# Altium footprint library Transformers.PcbLib: 81 footprints (part 2 of 6) (continued)
## XFMR_CERN_HCRALWW [mm] "CERN HF Power Transformer RM8" (continued)
Mechanical 14:
  drawing of 158 lines, arcs and shapes, not listed
  text "12" at -12.383,-6.35 h1
  text "11" at -11.43,-2.54 h1
  text "8" at 1.587,10.477 h1
  text "7" at 5.397,10.795 h1
  text "6" at 10.795,5.08 h1
  text "5" at 10.16,1.27 h1
  text "2" at -2.54,-11.43 h1
  text "1" at -5.715,-11.747 h1
3D body "XFMR_CERN_HCRALWW.stp": height 16.5, standoff -3.32, extent -10.555,-10.51 10.464,10.51

## XFMR_CERN_HCRAMPO001 [mm] "CERN HF Current transformer"
height 6.35
pads (2):
  rect 8x6.4 smd paste-4 mask+0.1: 1(-17.5,0) 2(17.5,0)
Keep-Out Layer:
  board cut-out: -5.25,-8.5 -5.25,-2.6 -12,-2.6 -12.098,-2.6 -12.292,-2.562 -12.474,-2.486 -12.637,-2.377 -12.777,-2.237 -12.886,-2.074 -12.962,-1.892 -13,-1.698 -13,-1.6 -13,1.6 -13,1.698 -12.962,1.892 -12.886,2.074 -12.777,2.237 -12.637,2.377 -12.474,2.486 -12.292,2.562 -12.098,2.6 -12,2.6 -5.25,2.6 -5.25,8.5 -5.25,8.598 -5.212,8.792 -5.136,8.974 -5.027,9.137 -4.887,9.277 -4.724,9.386 -4.542,9.462 -4.348,9.5 -4.25,9.5 4.25,9.5 4.348,9.5 4.542,9.462 4.724,9.386 4.887,9.277 5.027,9.137 5.136,8.974 5.212,8.792 5.25,8.598 5.25,8.5 5.25,2.6 12,2.6 12.098,2.6 12.292,2.562 12.474,2.486 12.637,2.377 12.777,2.237 12.886,2.074 12.962,1.892 13,1.698 13,1.6 13,-1.6 13,-1.698 12.962,-1.892 12.886,-2.074 12.777,-2.237 12.637,-2.377 12.474,-2.486 12.292,-2.562 12.098,-2.6 12,-2.6 5.25,-2.6 5.25,-8.5 5.25,-8.598 5.212,-8.792 5.136,-8.974 5.027,-9.137 4.887,-9.277 4.724,-9.386 4.542,-9.462 4.348,-9.5 4.25,-9.5 -4.25,-9.5 -4.348,-9.5 -4.542,-9.462 -4.724,-9.386 -4.887,-9.277 -5.027,-9.137 -5.136,-8.974 -5.212,-8.792 -5.25,-8.598
Mechanical 1:
  lines w1.27: -13,-1.6 ccw(c-12,-1.6) -12,-2.6 -5.25,-2.6 -5.25,-8.5 ccw(c-4.25,-8.5) -4.25,-9.5 4.25,-9.5 ccw(c4.25,-8.5) 5.25,-8.5 5.25,-2.6 12,-2.6 ccw(c12,-1.6) 13,-1.6 13,1.6 ccw(c12,1.6) 12,2.6 5.25,2.6 5.25,8.5 ccw(c4.25,8.5) 4.25,9.5 -4.25,9.5 ccw(c-4.25,8.5) -5.25,8.5 -5.25,2.6 -12,2.6 ccw(c-12,1.6) -13,1.6 -13,-1.6
Mechanical 8:
  lines w0.1: -18,0 -17.5,0 ; -17.5,-0.5 -17.5,0 ; -17.5,0.5 -17.5,0 ; -17,0 -17.5,0 ; -0.5,0 0,0 ; 0,-0.5 0,0 ; 0,0.5 0,0 ; 0.5,0 0,0 ; 17,0 17.5,0 ; 17.5,-0.5 17.5,0 ; 17.5,0.5 17.5,0 ; 18,0 17.5,0 ; -21.5,-3.2 -21.5,3.2 ; -21.5,-3.2 -13.5,-3.2 ; -21.5,-3.2 -21.5,3.2 ; -21.5,-3.2 -13.5,-3.2 ; -21.5,3.2 -13.5,3.2 ; -21.5,3.2 -13.5,3.2 ; -13.5,-3.2 -13.5,3.2 ; 13.5,-3.2 13.5,3.2 ; 13.5,-3.2 21.5,-3.2 ; 13.5,-3.2 21.5,-3.2 ; 13.5,3.2 21.5,3.2 ; 13.5,3.2 21.5,3.2 ; 21.5,-3.2 21.5,3.2 ; 21.5,-3.2 21.5,3.2
Mechanical 14:
  lines w0.1: -12.5,-1.5 -17.55,-1.5 -17.55,1.5 -12.5,1.5 ; -4.7,-2.1 -12.5,-2.1 -12.5,2.1 -4.7,2.1 ; -3.5,-2.3 -2.895,-2.3 ; -3.5,2.3 -2.895,2.3 ; -3.138,-6.666 ccw(c-3.05,-6.818) -3.05,-6.993 3.05,-6.993 ccw(c3.05,-6.818) 3.138,-6.666 ; -2.895,-6.34 -2.895,-6.107 ; -2.895,-5.757 -2.895,-5.266 ; -2.895,-4.916 -2.895,-4.201 ; -2.895,-3.851 -2.895,-2.961 ; -2.895,-2.611 -2.895,-1.599 ; -2.895,-1.249 -2.895,-0.175 ; -2.895,0.175 -2.895,1.249 ; -2.895,1.599 -2.895,2.611 ; -2.895,2.961 -2.895,3.87 ; -2.895,4.22 -2.895,4.916 ; -2.895,5.266 -2.895,5.757 ; -2.895,6.107 -2.895,6.286 ; -2.895,6.636 -2.895,6.637 ; 2.895,-6.34 2.895,-6.107 ; 2.895,-5.757 2.895,-5.266 ; 2.895,-4.916 2.895,-4.201 ; 2.895,-3.851 2.895,-2.961 ; 2.895,-2.611 2.895,-1.599 ; 2.895,-2.3 3.5,-2.3 ; 2.895,-1.249 2.895,-0.175 ; 2.895,0.175 2.895,1.249 ; 2.895,1.599 2.895,2.611 ; 2.895,2.3 3.5,2.3 ; 2.895,2.961 2.895,3.87 ; 2.895,4.22 2.895,4.916 ; 2.895,5.266 2.895,5.757 ; 2.895,6.107 2.895,6.286 ; 2.895,6.636 2.895,6.637 ; 4.7,-2.1 12.5,-2.1 12.5,2.1 4.7,2.1 ; 12.5,-1.5 17.55,-1.5 17.55,1.5 12.5,1.5 ; -4.7,-7 -4.7,7 -3.5,7 -3.5,-7 -4.7,-7 ; -3.05,-6.69 cw(c-3.05,-6.515) -3.05,-6.34 3.05,-6.34 cw(c3.05,-6.515) 3.05,-6.69 -3.05,-6.69 ; -3.05,-6.107 cw(c-3.05,-5.932) -3.05,-5.757 3.05,-5.757 cw(c3.05,-5.932) 3.05,-6.107 -3.05,-6.107 ; -3.05,-5.266 cw(c-3.05,-5.091) -3.05,-4.916 3.05,-4.916 cw(c3.05,-5.091) 3.05,-5.266 -3.05,-5.266 ; -3.05,-4.201 cw(c-3.05,-4.026) -3.05,-3.851 3.05,-3.851 cw(c3.05,-4.026) 3.05,-4.201 -3.05,-4.201 ; -3.05,-2.961 cw(c-3.05,-2.786) -3.05,-2.611 3.05,-2.611 cw(c3.05,-2.786) 3.05,-2.961 -3.05,-2.961 ; -3.05,-1.599 cw(c-3.05,-1.424) -3.05,-1.249 3.05,-1.249 cw(c3.05,-1.424) 3.05,-1.599 -3.05,-1.599 ; -3.05,-0.175 cw(c-3.05,0) -3.05,0.175 3.05,0.175 cw(c3.05,0) 3.05,-0.175 -3.05,-0.175 ; -3.05,1.249 cw(c-3.05,1.424) -3.05,1.599 3.05,1.599 cw(c3.05,1.424) 3.05,1.249 -3.05,1.249 ; -3.05,2.611 cw(c-3.05,2.786) -3.05,2.961 3.05,2.961 cw(c3.05,2.786) 3.05,2.611 -3.05,2.611 ; -3.05,3.87 cw(c-3.05,4.045) -3.05,4.22 3.05,4.22 cw(c3.05,4.045) 3.05,3.87 -3.05,3.87 ; -3.05,4.916 cw(c-3.05,5.091) -3.05,5.266 3.05,5.266 cw(c3.05,5.091) 3.05,4.916 -3.05,4.916 ; -3.05,5.757 cw(c-3.05,5.932) -3.05,6.107 3.05,6.107 cw(c3.05,5.932) 3.05,5.757 -3.05,5.757 ; -3.05,6.286 cw(c-3.05,6.461) -3.05,6.636 3.05,6.636 cw(c3.05,6.461) 3.05,6.286 -3.05,6.286 ; -3.05,6.637 cw(c-3.05,6.812) -3.05,6.987 3.05,6.987 cw(c3.05,6.812) 3.05,6.637 -3.05,6.637 ; 3.5,-7 3.5,7 4.7,7 4.7,-7 3.5,-7
Drill Drawing:
  lines w0.1: -12.06,0.658 -13,1 ; -12.06,1.342 -13,1 ; -4.31,4.658 -5.25,5 ; -4.31,5.342 -5.25,5 ; -2.342,-8.56 -2,-9.5 ; -2.342,8.56 -2,9.5 ; -1.658,-8.56 -2,-9.5 ; -1.658,8.56 -2,9.5 ; 0.998,-7.711 3.548,-7.711 4.999,-9.163 ; 4.093,-8.74 4.999,-9.163 ; 4.31,4.658 5.25,5 ; 4.31,5.342 5.25,5 ; 4.576,-8.256 4.999,-9.163 ; 8.908,-1.66 9.25,-2.6 ; 8.908,1.66 9.25,2.6 ; 9.592,-1.66 9.25,-2.6 ; 9.592,1.66 9.25,2.6 ; 12.06,0.658 13,1 ; 12.06,1.342 13,1 ; -13,1 13,1 ; -5.25,5 5.25,5 ; -2,-9.5 -2,9.5 ; 9.25,-2.6 9.25,2.6 ; -13,-1.6 ccw(c-12,-1.6) -12,-2.6 -5.25,-2.6 -5.25,-8.5 ccw(c-4.25,-8.5) -4.25,-9.5 4.25,-9.5 ccw(c4.25,-8.5) 5.25,-8.5 5.25,-2.6 12,-2.6 ccw(c12,-1.6) 13,-1.6 13,1.6 ccw(c12,1.6) 12,2.6 5.25,2.6 5.25,8.5 ccw(c4.25,8.5) 4.25,9.5 -4.25,9.5 ccw(c-4.25,8.5) -5.25,8.5 -5.25,2.6 -12,2.6 ccw(c-12,1.6) -13,1.6 -13,-1.6
  text "r1" at 1.587,-7.302 h1
  text "19" at -2.222,-2.611 h1
  text "10.5" at 0,5.266 h1
  text "26" at -0.953,1.27 h1
  text "5.2" at 6.35,-0.953 h1
3D body "XFMR_CERN_HCRAMPO001.stp": height 6.52, standoff -7.52, extent -17.55,-7 17.55,7

## XFMR_CLAIRTRONIC_14102 [mm] "CLAIRTRONIC 14102 Encapsulated Transformer 3.5VA - Body 41X35mm"
height 26
pads (6):
  round 1.6 hole 1.1: 1(-12.75,10) 2(-12.75,-10) 3(12.75,10) 4(12.75,5) 5(12.75,-5) 6(12.75,-10)
Top Overlay:
  lines w0.2: -11.25,-10 -10.25,-10 -10.25,-5.25 ccw(c-10.25,-4.5) -10.25,-3.75 ccw(c-10.25,-3) -10.25,-2.25 ccw(c-10.25,-1.5) -10.25,-0.75 ccw(c-10.25,0) -10.25,0.75 ccw(c-10.25,1.5) -10.25,2.25 ccw(c-10.25,3) -10.25,3.75 ccw(c-10.25,4.5) -10.25,5.25 -10.25,10 -11.25,10 ; -0.5,-10 -0.5,10 ; 0.5,-10 0.5,10 ; 11.25,-10 10.25,-10 10.25,-9.75 cw(c10.25,-9) 10.25,-8.25 cw(c10.25,-7.5) 10.25,-6.75 cw(c10.25,-6) 10.25,-5.25 10.25,-5 11.25,-5 ; 11.25,5 10.25,5 10.25,5.25 cw(c10.25,6) 10.25,6.75 cw(c10.25,7.5) 10.25,8.25 cw(c10.25,9) 10.25,9.75 10.25,10 11.25,10 ; -17.5,-20.5 -17.5,20.5 17.5,20.5 17.5,-20.5 -17.5,-20.5
  text "SEC" at 8.85,-9.036 h1.2
  text "SEC" at 8.85,5.964 h1.2
  text "PRIM" at -7.564,-1.746 h1.2
Mechanical 14:
  lines w0.1: -11.25,-10 -10.25,-10 -10.25,-5.25 ccw(c-10.25,-4.5) -10.25,-3.75 ccw(c-10.25,-3) -10.25,-2.25 ccw(c-10.25,-1.5) -10.25,-0.75 ccw(c-10.25,0) -10.25,0.75 ccw(c-10.25,1.5) -10.25,2.25 ccw(c-10.25,3) -10.25,3.75 ccw(c-10.25,4.5) -10.25,5.25 -10.25,10 -11.25,10 ; -0.5,-10 -0.5,10 ; 0.5,-10 0.5,10 ; 11.25,-10 10.25,-10 10.25,-9.75 cw(c10.25,-9) 10.25,-8.25 cw(c10.25,-7.5) 10.25,-6.75 cw(c10.25,-6) 10.25,-5.25 10.25,-5 11.25,-5 ; 11.25,5 10.25,5 10.25,5.25 cw(c10.25,6) 10.25,6.75 cw(c10.25,7.5) 10.25,8.25 cw(c10.25,9) 10.25,9.75 10.25,10 11.25,10 ; -17.5,-20.5 -17.5,20.5 17.5,20.5 17.5,-20.5 -17.5,-20.5
  text "SEC" at 8.85,-9.036 h1.2
  text "SEC" at 8.85,5.964 h1.2
  text "PRIM" at -7.564,-1.746 h1.2
3D body "XFMR_CLAIRTRONIC_14102.stp": height 28, standoff -3.2, extent -17.5,-20.5 17.5,20.5

## XFMR_COILCRAFT_1812WBT2 [mm] "Surface Mount Wideband RF Transformer, Body 4.95 x 3.81mm"
height 3.43
pads (4):
  round 0.5 smd paste-0.26 mask-0.26: 1(-2.07,-0.955) 2(2.07,-0.955) 3(2.07,0.955) 4(-2.07,0.955)
Top Layer:
  region: -2.68,1.68 -1.46,1.68 -1.46,0.74 -1.84,0.23 -2.68,0.23
  region: -2.68,-1.68 -1.46,-1.68 -1.46,-0.74 -1.84,-0.23 -2.68,-0.23
  region: 2.68,-1.68 1.46,-1.68 1.46,-0.74 1.84,-0.23 2.68,-0.23
  region: 2.68,1.68 1.46,1.68 1.46,0.74 1.84,0.23 2.68,0.23
Top Overlay:
  circle w0.25: c-3.25,-0.975 r0.125
  lines w0.2: -2.475,-2.03 2.475,-2.03 ; -2.475,2.03 2.475,2.03
Mechanical 8:
  lines w0.1: -2.57,-0.955 -2.07,-0.955 ; -2.57,0.955 -2.07,0.955 ; -2.07,-1.455 -2.07,-0.955 ; -2.07,-0.455 -2.07,-0.955 ; -2.07,0.455 -2.07,0.955 ; -2.07,1.455 -2.07,0.955 ; -1.57,-0.955 -2.07,-0.955 ; -1.57,0.955 -2.07,0.955 ; -0.5,0 0,0 ; 0,-0.5 0,0 ; 0,0.5 0,0 ; 0.5,0 0,0 ; 1.57,-0.955 2.07,-0.955 ; 1.57,0.955 2.07,0.955 ; 2.07,-1.455 2.07,-0.955 ; 2.07,-0.455 2.07,-0.955 ; 2.07,0.455 2.07,0.955 ; 2.07,1.455 2.07,0.955 ; 2.57,-0.955 2.07,-0.955 ; 2.57,0.955 2.07,0.955 ; -2.68,-1.68 -2.68,-0.23 -1.84,-0.23 -1.46,-0.74 -1.46,-1.68 -2.68,-1.68 ; -2.68,0.23 -2.68,1.68 -1.46,1.68 -1.46,0.74 -1.84,0.23 -2.68,0.23 ; 1.46,-1.68 1.46,-0.74 1.84,-0.23 2.68,-0.23 2.68,-1.68 1.46,-1.68 ; 1.46,0.74 1.46,1.68 2.68,1.68 2.68,0.23 1.84,0.23 1.46,0.74
Mechanical 14:
  circle w0.25: c-3.25,-0.975 r0.125
  circle w0.1: c-1.95,-0.975 r0.3
  lines w0.1: -2.475,-1.53 2.475,-1.53 ; -2.475,1.53 2.475,1.53 ; -1.293,-1.53 -1.293,1.53 ; 1.293,-1.53 1.293,1.53 ; -2.475,-2.03 -2.475,2.03 2.475,2.03 2.475,-2.03 -2.475,-2.03
Mechanical 15:
  lines w0.05: -2.93,-2.28 -2.93,2.28 2.93,2.28 2.93,-2.28 -2.93,-2.28
3D body "XFMR_COILCRAFT_1812WBT2.stp": height 3.44, standoff 0, extent -2.475,-2.03 2.475,2.03

## XFMR_COILCRAFT_GA3459-BL [mm] "Flyback Transformer, Body 26 x 26.75mm"
height 14
pads (12):
  rect 2.75x2 smd: 1(-15.475,10) 2(-15.475,6) 3(-15.475,2) 4(-15.475,-2) 5(-15.475,-6) 6(-15.475,-10) 7(15.475,-10) 8(15.475,-6) 9(15.475,-2) 10(15.475,2) 11(15.475,6) 12(15.475,10)
Top Overlay:
  circle w0.25: c-15.74,12.7 r0.5
  lines w0.2: -13,-3.5 -8.5,-3.5 ; -13,3.5 -8.5,3.5 ; -8.5,-13.375 -8.5,13.375 ; 8.5,-13.375 8.5,13.375 ; 8.5,-3.5 13,-3.5 ; 8.5,3.5 13,3.5 ; -13,-13.375 -13,13.375 13,13.375 13,-13.375 -13,-13.375
Mechanical 8:
  lines w0.1: -15.975,-10 -15.475,-10 ; -15.975,-6 -15.475,-6 ; -15.975,-2 -15.475,-2 ; -15.975,2 -15.475,2 ; -15.975,6 -15.475,6 ; -15.975,10 -15.475,10 ; -15.475,-10.5 -15.475,-10 ; -15.475,-9.5 -15.475,-10 ; -15.475,-6.5 -15.475,-6 ; -15.475,-5.5 -15.475,-6 ; -15.475,-2.5 -15.475,-2 ; -15.475,-1.5 -15.475,-2 ; -15.475,1.5 -15.475,2 ; -15.475,2.5 -15.475,2 ; -15.475,5.5 -15.475,6 ; -15.475,6.5 -15.475,6 ; -15.475,9.5 -15.475,10 ; -15.475,10.5 -15.475,10 ; -14.975,-10 -15.475,-10 ; -14.975,-6 -15.475,-6 ; -14.975,-2 -15.475,-2 ; -14.975,2 -15.475,2 ; -14.975,6 -15.475,6 ; -14.975,10 -15.475,10 ; -0.5,0 0,0 ; 0,-0.5 0,0 ; 0,0.5 0,0 ; 0.5,0 0,0 ; 14.975,-10 15.475,-10 ; 14.975,-6 15.475,-6 ; 14.975,-2 15.475,-2 ; 14.975,2 15.475,2 ; 14.975,6 15.475,6 ; 14.975,10 15.475,10 ; 15.475,-10.5 15.475,-10 ; 15.475,-9.5 15.475,-10 ; 15.475,-6.5 15.475,-6 ; 15.475,-5.5 15.475,-6 ; 15.475,-2.5 15.475,-2 ; 15.475,-1.5 15.475,-2 ; 15.475,1.5 15.475,2 ; 15.475,2.5 15.475,2 ; 15.475,5.5 15.475,6 ; 15.475,6.5 15.475,6 ; 15.475,9.5 15.475,10 ; 15.475,10.5 15.475,10 ; 15.975,-10 15.475,-10 ; 15.975,-6 15.475,-6 ; 15.975,-2 15.475,-2 ; 15.975,2 15.475,2 ; 15.975,6 15.475,6 ; 15.975,10 15.475,10 ; -16.85,-11 -16.85,-9 -14.1,-9 -14.1,-11 -16.85,-11 ; -16.85,-7 -16.85,-5 -14.1,-5 -14.1,-7 -16.85,-7 ; -16.85,-3 -16.85,-1 -14.1,-1 -14.1,-3 -16.85,-3 ; -16.85,1 -16.85,3 -14.1,3 -14.1,1 -16.85,1 ; -16.85,5 -16.85,7 -14.1,7 -14.1,5 -16.85,5 ; -16.85,9 -16.85,11 -14.1,11 -14.1,9 -16.85,9 ; 14.1,-11 14.1,-9 16.85,-9 16.85,-11 14.1,-11 ; 14.1,-7 14.1,-5 16.85,-5 16.85,-7 14.1,-7 ; 14.1,-3 14.1,-1 16.85,-1 16.85,-3 14.1,-3 ; 14.1,1 14.1,3 16.85,3 16.85,1 14.1,1 ; 14.1,5 14.1,7 16.85,7 16.85,5 14.1,5 ; 14.1,9 14.1,11 16.85,11 16.85,9 14.1,9
Mechanical 14:
  circle w0.1: c-10.46,10.16 r1
  lines w0.1: -13,-3.5 -8.5,-3.5 ; -13,3.5 -8.5,3.5 ; -8.5,-13.375 -8.5,13.375 ; 8.5,-13.375 8.5,13.375 ; 8.5,-3.5 13,-3.5 ; 8.5,3.5 13,3.5 ; -13,-13.375 -13,13.375 13,13.375 13,-13.375 -13,-13.375
Mechanical 15:
  lines w0.05: -17.1,-13.625 17.1,-13.625 17.1,13.625 -17.1,13.625 -17.1,-13.625
3D body "XFMR_COILCRAFT_GA3459-BL.stp": height 14, standoff 0, extent -16.325,-13.375 16.325,13.375

## XFMR_COILCRAFT_PWB [mm] "Surface Mount Wideband RF Transformer, Body 6.48mm x 6.48mm"
height 4.65
pads (6):
  rect 1.52x1.27 smd: 1(-2.925,2.54) 2(-2.925,0) 3(-2.925,-2.54) 4(2.925,-2.54) 5(2.925,0) 6(2.925,2.54)
Top Overlay:
  circle w0.25: c-4.4,2.6 r0.125
  lines w0.2: -1.765,-3.485 1.765,-3.485 ; -1.765,3.485 1.765,3.485
Mechanical 8:
  lines w0.1: -3.425,-2.54 -2.925,-2.54 ; -3.425,0 -2.925,0 ; -3.425,2.54 -2.925,2.54 ; -2.925,-3.04 -2.925,-2.54 ; -2.925,-2.04 -2.925,-2.54 ; -2.925,-0.5 -2.925,0 ; -2.925,0.5 -2.925,0 ; -2.925,2.04 -2.925,2.54 ; -2.925,3.04 -2.925,2.54 ; -2.425,-2.54 -2.925,-2.54 ; -2.425,0 -2.925,0 ; -2.425,2.54 -2.925,2.54 ; -0.5,0 0,0 ; 0,-0.5 0,0 ; 0,0.5 0,0 ; 0.5,0 0,0 ; 2.425,-2.54 2.925,-2.54 ; 2.425,0 2.925,0 ; 2.425,2.54 2.925,2.54 ; 2.925,-3.04 2.925,-2.54 ; 2.925,-2.04 2.925,-2.54 ; 2.925,-0.5 2.925,0 ; 2.925,0.5 2.925,0 ; 2.925,2.04 2.925,2.54 ; 2.925,3.04 2.925,2.54 ; 3.425,-2.54 2.925,-2.54 ; 3.425,0 2.925,0 ; 3.425,2.54 2.925,2.54 ; -3.685,-3.175 -3.685,-1.905 -2.165,-1.905 -2.165,-3.175 -3.685,-3.175 ; -3.685,-0.635 -3.685,0.635 -2.165,0.635 -2.165,-0.635 -3.685,-0.635 ; -3.685,1.905 -3.685,3.175 -2.165,3.175 -2.165,1.905 -3.685,1.905 ; 2.165,-3.175 2.165,-1.905 3.685,-1.905 3.685,-3.175 2.165,-3.175 ; 2.165,-0.635 2.165,0.635 3.685,0.635 3.685,-0.635 2.165,-0.635 ; 2.165,1.905 2.165,3.175 3.685,3.175 3.685,1.905 2.165,1.905
Mechanical 14:
  lines w0.1: -3.34,-2.79 -3.6,-2.79 -3.6,-2.29 -3.34,-2.29 ; -3.34,-0.25 -3.6,-0.25 -3.6,0.25 -3.34,0.25 ; -3.34,2.29 -3.6,2.29 -3.6,2.79 -3.34,2.79 ; -3.34,2.635 -2.7,2.635 -2.7,3.079 -3.34,3.079 ; 3.34,-2.79 3.6,-2.79 3.6,-2.29 3.34,-2.29 ; 3.34,-0.25 3.6,-0.25 3.6,0.25 3.34,0.25 ; 3.34,2.29 3.6,2.29 3.6,2.79 3.34,2.79 ; -3.34,-3.485 -3.34,3.485 3.34,3.485 3.34,-3.485 -3.34,-3.485
Mechanical 15:
  lines w0.05: -3.935,-3.735 3.935,-3.735 3.935,3.735 -3.935,3.735 -3.935,-3.735
3D body "XFMR_COILCRAFT_PWB.stp": height 4.65, standoff 0, extent -3.6,-3.485 3.6,3.485

## XFMR_COILCRAFT_Q4470 [mm] "Miniature Surface Mount Transformer, Body 6.6mm x 8.89mm"
height 5.46
pads (6):
  rect 1.27x1.27 smd: 1(-4.13,2.54) 2(-4.13,0) 3(-4.13,-2.54) 4(4.13,-2.54) 5(4.13,0) 6(4.13,2.54)
Top Overlay:
  circle w0.25: c-4.125,3.8 r0.125
  lines w0.2: -3.145,-3.525 -3.145,3.525 3.145,3.525 3.145,-3.525 -3.145,-3.525
Mechanical 8:
  lines w0.1: -4.63,-2.54 -4.13,-2.54 ; -4.63,0 -4.13,0 ; -4.63,2.54 -4.13,2.54 ; -4.13,-3.04 -4.13,-2.54 ; -4.13,-2.04 -4.13,-2.54 ; -4.13,-0.5 -4.13,0 ; -4.13,0.5 -4.13,0 ; -4.13,2.04 -4.13,2.54 ; -4.13,3.04 -4.13,2.54 ; -3.63,-2.54 -4.13,-2.54 ; -3.63,0 -4.13,0 ; -3.63,2.54 -4.13,2.54 ; -1,0 0,0 ; 0,-1 0,0 ; 0,1 0,0 ; 1,0 0,0 ; 3.63,-2.54 4.13,-2.54 ; 3.63,0 4.13,0 ; 3.63,2.54 4.13,2.54 ; 4.13,-3.04 4.13,-2.54 ; 4.13,-2.04 4.13,-2.54 ; 4.13,-0.5 4.13,0 ; 4.13,0.5 4.13,0 ; 4.13,2.04 4.13,2.54 ; 4.13,3.04 4.13,2.54 ; 4.63,-2.54 4.13,-2.54 ; 4.63,0 4.13,0 ; 4.63,2.54 4.13,2.54 ; -4.765,-3.175 -4.765,-1.905 -3.495,-1.905 -3.495,-3.175 -4.765,-3.175 ; -4.765,-0.635 -4.765,0.635 -3.495,0.635 -3.495,-0.635 -4.765,-0.635 ; -4.765,1.905 -4.765,3.175 -3.495,3.175 -3.495,1.905 -4.765,1.905 ; 3.495,-3.175 3.495,-1.905 4.765,-1.905 4.765,-3.175 3.495,-3.175 ; 3.495,-0.635 3.495,0.635 4.765,0.635 4.765,-0.635 3.495,-0.635 ; 3.495,1.905 3.495,3.175 4.765,3.175 4.765,1.905 3.495,1.905
Mechanical 14:
  circle w0.1: c-2.457,2.75 r0.4
  lines w0.1: -3.3,-2.84 -4.445,-2.84 -4.445,-2.24 -3.3,-2.24 ; -3.3,-0.3 -4.445,-0.3 -4.445,0.3 -3.3,0.3 ; -3.3,2.24 -4.445,2.24 -4.445,2.84 -3.3,2.84 ; 3.3,-2.84 4.445,-2.84 4.445,-2.24 3.3,-2.24 ; 3.3,-0.3 4.445,-0.3 4.445,0.3 3.3,0.3 ; 3.3,2.24 4.445,2.24 4.445,2.84 3.3,2.84 ; -3.3,-3.495 -3.3,3.495 3.3,3.495 3.3,-3.495 -3.3,-3.495
Mechanical 15:
  lines w0.05: -5.015,-3.745 5.015,-3.745 5.015,3.745 -5.015,3.745 -5.015,-3.745
3D body "XFMR_COILCRAFT_Q4470.stp": height 5.46, standoff 0, extent -4.445,-3.495 4.445,3.495

## XFMR_COILCRAFT_TTWB [mm] "Surface Mount Wideband RF Transformer, Body 6.48mm x 6.1mm"
height 4.82
pads (6):
  rect 1.14x1.27 smd: 1(-2.73,2.54) 2(-2.73,0) 3(-2.73,-2.54) 4(2.73,-2.54) 5(2.73,0) 6(2.73,2.54)
Top Overlay:
  circle w0.2: c0.076,2.158 r0.25
  circle w0.2: c-0.75,2.158 r0.25
  circle w0.2: c0.95,2.158 r0.25
  circle w0.25: c-3.8,2.6 r0.125
  lines w0.2: -3.302,-1.605 -3.302,-0.935 ; -3.302,0.935 -3.302,1.605 ; -1.86,-3.112 1.86,-3.112 ; -1.86,3.112 1.86,3.112 ; 3.302,-1.605 3.302,-0.935 ; 3.302,0.935 3.302,1.605
Mechanical 8:
  lines w0.1: -3.23,-2.54 -2.73,-2.54 ; -3.23,0 -2.73,0 ; -3.23,2.54 -2.73,2.54 ; -2.73,-3.04 -2.73,-2.54 ; -2.73,-2.04 -2.73,-2.54 ; -2.73,-0.5 -2.73,0 ; -2.73,0.5 -2.73,0 ; -2.73,2.04 -2.73,2.54 ; -2.73,3.04 -2.73,2.54 ; -2.23,-2.54 -2.73,-2.54 ; -2.23,0 -2.73,0 ; -2.23,2.54 -2.73,2.54 ; -0.5,0 0,0 ; 0,-0.5 0,0 ; 0,0.5 0,0 ; 0.5,0 0,0 ; 2.23,-2.54 2.73,-2.54 ; 2.23,0 2.73,0 ; 2.23,2.54 2.73,2.54 ; 2.73,-3.04 2.73,-2.54 ; 2.73,-2.04 2.73,-2.54 ; 2.73,-0.5 2.73,0 ; 2.73,0.5 2.73,0 ; 2.73,2.04 2.73,2.54 ; 2.73,3.04 2.73,2.54 ; 3.23,-2.54 2.73,-2.54 ; 3.23,0 2.73,0 ; 3.23,2.54 2.73,2.54 ; -3.3,-3.175 -2.16,-3.175 -2.16,-1.905 -3.3,-1.905 -3.3,-3.175 ; -3.3,-0.635 -2.16,-0.635 -2.16,0.635 -3.3,0.635 -3.3,-0.635 ; -3.3,1.905 -2.16,1.905 -2.16,3.175 -3.3,3.175 -3.3,1.905 ; 2.16,-3.175 3.3,-3.175 3.3,-1.905 2.16,-1.905 2.16,-3.175 ; 2.16,-0.635 3.3,-0.635 3.3,0.635 2.16,0.635 2.16,-0.635 ; 2.16,1.905 3.3,1.905 3.3,3.175 2.16,3.175 2.16,1.905
Mechanical 14:
  circle w0.1: c2.223,2.158 r0.25
  circle w0.1: c-2.109,2.158 r0.25
  circle w0.1: c0.076,2.158 r0.25
  lines w0.1: -3.302,-3.112 -3.302,3.112 3.302,3.112 3.302,-3.112 -3.302,-3.112
Mechanical 15:
  lines w0.05: -3.552,-3.362 -3.552,3.362 3.552,3.362 3.552,-3.362 -3.552,-3.362
3D body "XFMR_COILCRAFT_TTWB.stp": height 4.7, standoff 0, extent -3.302,-3.111 3.302,3.112

## XFMR_COILCRAFT_WBC [mm] "Surface Mount Mini Wideband Transformer, Body 4.19mm x 4.45mm"
height 3.05
pads (6):
  rect 1.14x0.76 smd: 1(-1.525,-1.52) 2(-1.525,0) 3(-1.525,1.52) 4(1.525,1.52) 5(1.525,0) 6(1.525,-1.52)
Top Overlay:
  circle w0.25: c-2.7,-1.6 r0.125
  lines w0.1: -0.655,-2.1 0.655,-2.1 ; -0.655,-1.9 0.655,-1.9 ; -0.655,1.9 0.655,1.9 ; -0.655,2.1 0.655,2.1
Mechanical 8:
  lines w0.1: -2.025,-1.52 -1.525,-1.52 ; -2.025,0 -1.525,0 ; -2.025,1.52 -1.525,1.52 ; -1.525,-2.02 -1.525,-1.52 ; -1.525,-1.02 -1.525,-1.52 ; -1.525,-0.5 -1.525,0 ; -1.525,0.5 -1.525,0 ; -1.525,1.02 -1.525,1.52 ; -1.525,2.02 -1.525,1.52 ; -1.025,-1.52 -1.525,-1.52 ; -1.025,0 -1.525,0 ; -1.025,1.52 -1.525,1.52 ; -0.5,0 0,0 ; 0,-0.5 0,0 ; 0,0.5 0,0 ; 0.5,0 0,0 ; 1.025,-1.52 1.525,-1.52 ; 1.025,0 1.525,0 ; 1.025,1.52 1.525,1.52 ; 1.525,-2.02 1.525,-1.52 ; 1.525,-1.02 1.525,-1.52 ; 1.525,-0.5 1.525,0 ; 1.525,0.5 1.525,0 ; 1.525,1.02 1.525,1.52 ; 1.525,2.02 1.525,1.52 ; 2.025,-1.52 1.525,-1.52 ; 2.025,0 1.525,0 ; 2.025,1.52 1.525,1.52 ; -2.095,-1.9 -0.955,-1.9 -0.955,-1.14 -2.095,-1.14 -2.095,-1.9 ; -2.095,-0.38 -0.955,-0.38 -0.955,0.38 -2.095,0.38 -2.095,-0.38 ; -2.095,1.14 -0.955,1.14 -0.955,1.9 -2.095,1.9 -2.095,1.14 ; 0.955,-1.9 2.095,-1.9 2.095,-1.14 0.955,-1.14 0.955,-1.9 ; 0.955,-0.38 2.095,-0.38 2.095,0.38 0.955,0.38 0.955,-0.38 ; 0.955,1.14 2.095,1.14 2.095,1.9 0.955,1.9 0.955,1.14
Mechanical 14:
  circle w0.1: c-0.525,-1.52 r0.25
  lines w0.1: -1.325,-0.508 cw(c-0.935,0.01) -1.325,0.528 ; 1.325,-0.508 ccw(c0.935,0.01) 1.325,0.528 ; -2.225,-2.1 2.225,-2.1 2.225,2.1 -2.225,2.1 -2.225,-2.1 ; -1.325,-1.9 1.325,-1.9 1.325,1.9 -1.325,1.9 -1.325,-1.9
Mechanical 15:
  lines w0.1: -2.475,-2.35 2.475,-2.35 2.475,2.35 -2.475,2.35 -2.475,-2.35
3D body "XFMR_COILCRAFT_WBC.stp": height 3.01, standoff 0, extent -2.225,-2.1 2.225,2.1

## XFMR_COMATEC_12052912 [mm] "230VAC to 9.5VAC 2VA, Custom Transformer, Body 28mm x 33mm"
height 27
pads (4):
  round 2.3 hole 1.6: 1(-10,10) 2(-10,-10) 3(10,5) 4(10,-5)
Top Overlay:
  lines w0.2: -10.25,-11.53 -10.25,-12.25 10.25,-12.25 10.25,-6.53 ; -10.25,-8.47 -10.25,8.47 ; -10.25,11.53 -10.25,12.25 10.25,12.25 10.25,6.53 ; 10.25,-3.47 10.25,3.47 ; -14,-16.5 -14,16.5 14,16.5 14,-16.5 -14,-16.5
  text "S1" at 12.825,-0.85 h1.2
  text "P1" at -11.5,-0.875 h1.2
Mechanical 8:
  lines w0.1: -10.5,-10 -10,-10 ; -10.5,10 -10,10 ; -10,-10.5 -10,-10 ; -10,-9.5 -10,-10 ; -10,9.5 -10,10 ; -10,10.5 -10,10 ; -9.5,-10 -10,-10 ; -9.5,10 -10,10 ; -0.5,0 0,0 ; 0,-0.5 0,0 ; 0,0.5 0,0 ; 0.5,0 0,0 ; 9.5,-5 10,-5 ; 9.5,5 10,5 ; 10,-5.5 10,-5 ; 10,-4.5 10,-5 ; 10,4.5 10,5 ; 10,5.5 10,5 ; 10.5,-5 10,-5 ; 10.5,5 10,5
Mechanical 14:
  lines w0.1: -14,-16.5 -14,16.5 14,16.5 14,-16.5 -14,-16.5 ; -10.25,-12.25 10.25,-12.25 10.25,12.25 -10.25,12.25 -10.25,-12.25
  text "S1" at 12.825,-0.85 h1.2
  text "P1" at -11.5,-0.875 h1.2
3D body "XFMR_COMATEC_12052912.stp": height 27, standoff -3.6, extent -14,-16.5 14,16.5